# Altium footprint library SAMTEC SMD.PcbLib: 165 footprints (part 9 of 17) (continued)
## SAMTEC_QMSS-026-06.75-L-D-PC4 [mm] "52 (2x26) Contacts, Pitch 0.635mm, Straight Double Row 0,635 mm, Q2 Shielded Ground Plane Combo Power Terminal Strip"
height 7.54
pads (61):
  rect 0.41x1.4 smd mask+0: 1(-7.938,-3.365) 2(-7.938,3.365) 3(-7.303,-3.365) 4(-7.303,3.365) 5(-6.668,-3.365) 6(-6.668,3.365) 7(-6.033,-3.365) 8(-6.033,3.365) 9(-5.398,-3.365) 10(-5.398,3.365) 11(-4.763,-3.365) 12(-4.763,3.365) 13(-4.128,-3.365) 14(-4.128,3.365) 15(-3.493,-3.365) 16(-3.493,3.365) 17(-2.858,-3.365) 18(-2.858,3.365) 19(-2.223,-3.365) 20(-2.223,3.365) 21(-1.588,-3.365) 22(-1.588,3.365) 23(-0.953,-3.365) 24(-0.953,3.365) 25(-0.318,-3.365) 26(-0.318,3.365) 27(0.317,-3.365) 28(0.317,3.365) 29(0.952,-3.365) 30(0.952,3.365) 31(1.587,-3.365) 32(1.587,3.365) 33(2.222,-3.365) 34(2.222,3.365) 35(2.857,-3.365) 36(2.857,3.365) 37(3.492,-3.365) 38(3.492,3.365) 39(4.127,-3.365) 40(4.127,3.365) 41(4.762,-3.365) 42(4.762,3.365) 43(5.397,-3.365) 44(5.397,3.365) 45(6.032,-3.365) 46(6.032,3.365) 47(6.667,-3.365) 48(6.667,3.365) 49(7.302,-3.365) 50(7.302,3.365) 51(7.937,-3.365) 52(7.937,3.365)
  rect 17.27x0.51 smd mask+0: P0(0,0)
  round 1.5 hole 0.75: P1(-15.355,-1.27) P2(-15.355,1.27) P3(-13.355,-1.27) P4(-13.355,1.27) P5(13.355,-1.27) P6(13.355,1.27) P7(15.355,-1.27) P8(15.355,1.27)
Top Layer:
  region: 16.155,-2.75 16.155,-0.21 14.555,-0.21 14.555,-2.75
  region: 14.155,-2.75 14.155,-0.21 12.555,-0.21 12.555,-2.75
  region: 16.155,0.21 16.155,2.75 14.555,2.75 14.555,0.21
  region: 16.155,0.21 16.155,2.75 14.555,2.75 14.555,0.21
  region: 14.155,0.21 14.155,2.75 12.555,2.75 12.555,0.21
  region: -12.555,-2.75 -12.555,-0.21 -14.155,-0.21 -14.155,-2.75
  region: -14.555,-2.75 -14.555,-0.21 -16.155,-0.21 -16.155,-2.75
  region: -12.555,0.21 -12.555,2.75 -14.155,2.75 -14.155,0.21
  region: -12.555,0.21 -12.555,2.75 -14.155,2.75 -14.155,0.21
  region: -14.555,0.21 -14.555,2.75 -16.155,2.75 -16.155,0.21
Top Overlay:
  drawing of 374 lines, arcs and shapes, not listed
  text "P8" at 14.957,4.125 h0.8
  text "P1" at -15.757,-4.925 h0.8
Mechanical 8:
  drawing of 404 lines, arcs and shapes, not listed
Mechanical 14:
  drawing of 475 lines, arcs and shapes, not listed
  text "P8" at 14.957,4.125 h0.8
  text "P1" at -15.757,-4.925 h0.8
Mechanical 15:
  lines w0.05: -17.522,-4.315 -17.522,4.315 17.522,4.315 17.522,-4.315 -17.522,-4.315
3D body "SAMTEC_QMSS-026-06.75-L-D-PC4.stp": height 7.62, standoff -1.73, extent -17.272,-3.759 17.272,3.759

## SAMTEC_QMSS-052-06.75-L-D-PC4 [mm] "104(4x26) Contacts, Pitch 0.635mm, Straight Double Row 0,635 mm, Q2 Shielded Ground Plane Combo Power Terminal Strip"
height 7.54
pads (114):
  rect 0.41x1.4 smd mask+0: 1(-18.602,-3.365) 2(-18.602,3.365) 3(-17.967,-3.365) 4(-17.967,3.365) 5(-17.332,-3.365) 6(-17.332,3.365) 7(-16.697,-3.365) 8(-16.697,3.365) 9(-16.062,-3.365) 10(-16.062,3.365) 11(-15.427,-3.365) 12(-15.427,3.365) 13(-14.792,-3.365) 14(-14.792,3.365) 15(-14.157,-3.365) 16(-14.157,3.365) 17(-13.522,-3.365) 18(-13.522,3.365) 19(-12.887,-3.365) 20(-12.887,3.365) 21(-12.252,-3.365) 22(-12.252,3.365) 23(-11.617,-3.365) 24(-11.617,3.365) 25(-10.982,-3.365) 26(-10.982,3.365) 27(-10.347,-3.365) 28(-10.347,3.365) 29(-9.712,-3.365) 30(-9.712,3.365) 31(-9.077,-3.365) 32(-9.077,3.365) 33(-8.442,-3.365) 34(-8.442,3.365) 35(-7.807,-3.365) 36(-7.807,3.365) 37(-7.172,-3.365) 38(-7.172,3.365) 39(-6.537,-3.365) 40(-6.537,3.365) 41(-5.902,-3.365) 42(-5.902,3.365) 43(-5.267,-3.365) 44(-5.267,3.365) 45(-4.632,-3.365) 46(-4.632,3.365) 47(-3.997,-3.365) 48(-3.997,3.365) 49(-3.362,-3.365) 50(-3.362,3.365) 51(-2.727,-3.365) 52(-2.727,3.365) 53(2.728,-3.365) 54(2.728,3.365) 55(3.363,-3.365) 56(3.363,3.365) 57(3.998,-3.365) 58(3.998,3.365) 59(4.633,-3.365) 60(4.633,3.365) 61(5.268,-3.365) 62(5.268,3.365) 63(5.903,-3.365) 64(5.903,3.365) 65(6.538,-3.365) 66(6.538,3.365) 67(7.173,-3.365) 68(7.173,3.365) 69(7.808,-3.365) 70(7.808,3.365) 71(8.443,-3.365) 72(8.443,3.365) 73(9.078,-3.365) 74(9.078,3.365) 75(9.713,-3.365) 76(9.713,3.365) 77(10.348,-3.365) 78(10.348,3.365) 79(10.983,-3.365) 80(10.983,3.365) 81(11.618,-3.365) 82(11.618,3.365) 83(12.253,-3.365) 84(12.253,3.365) 85(12.888,-3.365) 86(12.888,3.365) 87(13.523,-3.365) 88(13.523,3.365) 89(14.158,-3.365) 90(14.158,3.365) 91(14.793,-3.365) 92(14.793,3.365) 93(15.428,-3.365) 94(15.428,3.365) 95(16.063,-3.365) 96(16.063,3.365) 97(16.698,-3.365) 98(16.698,3.365) 99(17.333,-3.365) 100(17.333,3.365) 101(17.968,-3.365) 102(17.968,3.365) 103(18.603,-3.365) 104(18.603,3.365)
  round 1.5 hole 0.75: P1(-26.02,-1.27) P2(-26.02,1.27) P3(-24.02,-1.27) P4(-24.02,1.27) P5(24.026,-1.27) P6(24.026,1.27) P7(26.026,-1.27) P8(26.026,1.27)
  rect 17.27x0.51 smd mask+0: P01(-10.665,0) P02(10.665,0)
Top Layer:
  region: -23.22,-2.75 -23.22,-0.21 -24.82,-0.21 -24.82,-2.75
  region: -25.22,-2.75 -25.22,-0.21 -26.82,-0.21 -26.82,-2.75
  region: -23.22,0.21 -23.22,2.75 -24.82,2.75 -24.82,0.21
  region: -23.22,0.21 -23.22,2.75 -24.82,2.75 -24.82,0.21
  region: -25.22,0.21 -25.22,2.75 -26.82,2.75 -26.82,0.21
  region: 26.826,-2.75 26.826,-0.21 25.226,-0.21 25.226,-2.75
  region: 24.826,-2.75 24.826,-0.21 23.226,-0.21 23.226,-2.75
  region: 26.826,0.21 26.826,2.75 25.226,2.75 25.226,0.21
  region: 26.826,0.21 26.826,2.75 25.226,2.75 25.226,0.21
  region: 24.826,0.21 24.826,2.75 23.226,2.75 23.226,0.21
Top Overlay:
  drawing of 664 lines, arcs and shapes, not listed
  text "P8" at 25.628,4.125 h0.8
  text "P1" at -26.422,-4.925 h0.8
Mechanical 8:
  drawing of 736 lines, arcs and shapes, not listed
Mechanical 14:
  drawing of 784 lines, arcs and shapes, not listed
  text "P8" at 25.628,4.125 h0.8
  text "P1" at -26.422,-4.925 h0.8
Mechanical 15:
  lines w0.05: -28.187,-4.315 -28.187,4.315 28.193,4.315 28.193,-4.315 -28.187,-4.315
3D body "SAMTEC_QMSS-052-06.75-L-D-PC4.stp": height 7.62, standoff -1.73, extent -27.937,-3.759 27.943,3.759

## SAMTEC_QRF8-052-01-L-RA-GP-K [mm] "104 Contacts (2x52), Pitch 0.8mm, Right Angle Ground Plane Socket, QRF8-RA Series"
height 5.13
pads (127):
  rect 0.5x1.25 smd: 1(-22.4,-1.415) 2(-22.4,1.415) 3(-21.6,-1.415) 4(-21.6,1.415) 5(-20.8,-1.415) 6(-20.8,1.415) 7(-20,-1.415) 8(-20,1.415) 9(-19.2,-1.415) 10(-19.2,1.415) 11(-18.4,-1.415) 12(-18.4,1.415) 13(-17.6,-1.415) 14(-17.6,1.415) 15(-16.8,-1.415) 16(-16.8,1.415) 17(-16,-1.415) 18(-16,1.415) 19(-15.2,-1.415) 20(-15.2,1.415) 21(-14.4,-1.415) 22(-14.4,1.415) 23(-13.6,-1.415) 24(-13.6,1.415) 25(-12.8,-1.415) 26(-12.8,1.415) 27(-12,-1.415) 28(-12,1.415) 29(-11.2,-1.415) 30(-11.2,1.415) 31(-10.4,-1.415) 32(-10.4,1.415) 33(-9.6,-1.415) 34(-9.6,1.415) 35(-8.8,-1.415) 36(-8.8,1.415) 37(-8,-1.415) 38(-8,1.415) 39(-7.2,-1.415) 40(-7.2,1.415) 41(-6.4,-1.415) 42(-6.4,1.415) 43(-5.6,-1.415) 44(-5.6,1.415) 45(-4.8,-1.415) 46(-4.8,1.415) 47(-4,-1.415) 48(-4,1.415) 49(-3.2,-1.415) 50(-3.2,1.415) 51(-2.4,-1.415) 52(-2.4,1.415) 53(2.4,-1.415) 54(2.4,1.415) 55(3.2,-1.415) 56(3.2,1.415) 57(4,-1.415) 58(4,1.415) 59(4.8,-1.415) 60(4.8,1.415) 61(5.6,-1.415) 62(5.6,1.415) 63(6.4,-1.415) 64(6.4,1.415) 65(7.2,-1.415) 66(7.2,1.415) 67(8,-1.415) 68(8,1.415) 69(8.8,-1.415) 70(8.8,1.415) 71(9.6,-1.415) 72(9.6,1.415) 73(10.4,-1.415) 74(10.4,1.415) 75(11.2,-1.415) 76(11.2,1.415) 77(12,-1.415) 78(12,1.415) 79(12.8,-1.415) 80(12.8,1.415) 81(13.6,-1.415) 82(13.6,1.415) 83(14.4,-1.415) 84(14.4,1.415) 85(15.2,-1.415) 86(15.2,1.415) 87(16,-1.415) 88(16,1.415) 89(16.8,-1.415) 90(16.8,1.415) 91(17.6,-1.415) 92(17.6,1.415) 93(18.4,-1.415) 94(18.4,1.415) 95(19.2,-1.415) 96(19.2,1.415) 97(20,-1.415) 98(20,1.415) 99(20.8,-1.415) 100(20.8,1.415) 101(21.6,-1.415) 102(21.6,1.415) 103(22.4,-1.415) 104(22.4,1.415)
  round 1.05 hole 0.55: 105(-22.02,0) 106(-19.27,0) 107(-16.52,0) 108(-13.77,0) 109(-11.02,0) 110(-8.27,0) 111(-5.52,0) 112(-2.77,0) 113(2.78,0) 114(5.53,0) 115(8.28,0) 116(11.03,0) 117(13.78,0) 118(16.53,0) 119(19.28,0) 120(22.03,0)
  round 1.4 hole 0.7: 121(-27.4,5.155) 122(27.4,5.155) 123(0,3.965) 124(-24.66,-1.355) 125(24.66,-1.355)
  round 0.5 hole 1.45 unplated mask+0.475: 126(-25.3,3.525) 127(25.3,3.525)
Top Overlay:
  circle w0.25: c-23.325,-1.6 r0.125
  lines w0.2: -28.075,4.291 -28.075,-2.555 -23.988,-2.555 -23.988,-2.221 ; -28.075,5.899 -28.075,6.575 -27.423,6.575 -27.423,9.205 -24.702,9.205 -23.98,7.955 23.98,7.955 24.702,9.205 27.423,9.205 27.423,6.575 28.075,6.575 28.075,5.899 ; -23.971,-0.623 -23.387,2.295 -23.283,2.295 ; -23,-1.032 -23.283,-1.032 -23.283,2.295 ; -23,2.295 -23.283,2.295 ; -1.8,-1.032 -1.532,-1.032 -1.532,2.295 ; -1.8,2.295 1.8,2.295 ; 1.518,2.295 1.518,-1.032 1.8,-1.032 ; 23,-1.032 23.267,-1.032 23.267,2.295 ; 23,2.295 23.267,2.295 ; 23.971,-0.623 23.387,2.295 23.267,2.295 ; 23.988,-2.221 23.988,-2.555 28.075,-2.555 28.075,4.291
Mechanical 8:
  drawing of 754 lines, arcs and shapes, not listed
  text "Board Edge" at -5.7,7.725 h1.2
Mechanical 14:
  circle w0.1: c-23.323,-1.6 r0.25
  lines w0.1: -1.532,2.295 -1.532,-1.032 -23.283,-1.032 -23.283,2.295 ; 1.518,2.295 1.518,-1.032 23.267,-1.032 23.267,2.295 ; -23.283,2.295 23.267,2.295 ; -23.283,2.295 -23.387,2.295 -23.988,-0.705 -23.988,-2.555 -28.075,-2.555 -28.075,6.575 -27.423,6.575 -27.423,9.205 -24.702,9.205 -23.98,7.955 23.98,7.955 24.702,9.205 27.423,9.205 27.423,6.575 28.075,6.575 28.075,-2.555 23.988,-2.555 23.988,-0.705 23.387,2.295 23.267,2.295
Mechanical 15:
  lines w0.05: -28.325,-2.805 -28.325,9.455 28.325,9.455 28.325,-2.805 -28.325,-2.805
3D body "SAMTEC_QRF8-052-01-L-RA-GP-K.stp": height 5.13, standoff -1.33, extent -28.075,-2.555 28.075,9.205

## SAMTEC_QRF8-078-01-L-RA-GP [mm] "156 Contacts (3x52), Pitch 0.8mm, Right Angle Ground Plane Socket, QRF8-RA Series"
height 5.13
pads (188):
  rect 0.5x1.25 smd: 1(-34.8,-1.415) 2(-34.8,1.415) 3(-34,-1.415) 4(-34,1.415) 5(-33.2,-1.415) 6(-33.2,1.415) 7(-32.4,-1.415) 8(-32.4,1.415) 9(-31.6,-1.415) 10(-31.6,1.415) 11(-30.8,-1.415) 12(-30.8,1.415) 13(-30,-1.415) 14(-30,1.415) 15(-29.2,-1.415) 16(-29.2,1.415) 17(-28.4,-1.415) 18(-28.4,1.415) 19(-27.6,-1.415) 20(-27.6,1.415) 21(-26.8,-1.415) 22(-26.8,1.415) 23(-26,-1.415) 24(-26,1.415) 25(-25.2,-1.415) 26(-25.2,1.415) 27(-24.4,-1.415) 28(-24.4,1.415) 29(-23.6,-1.415) 30(-23.6,1.415) 31(-22.8,-1.415) 32(-22.8,1.415) 33(-22,-1.415) 34(-22,1.415) 35(-21.2,-1.415) 36(-21.2,1.415) 37(-20.4,-1.415) 38(-20.4,1.415) 39(-19.6,-1.415) 40(-19.6,1.415) 41(-18.8,-1.415) 42(-18.8,1.415) 43(-18,-1.415) 44(-18,1.415) 45(-17.2,-1.415) 46(-17.2,1.415) 47(-16.4,-1.415) 48(-16.4,1.415) 49(-15.6,-1.415) 50(-15.6,1.415) 51(-14.8,-1.415) 52(-14.8,1.415) 53(-10,-1.415) 54(-10,1.415) 55(-9.2,-1.415) 56(-9.2,1.415) 57(-8.4,-1.415) 58(-8.4,1.415) 59(-7.6,-1.415) 60(-7.6,1.415) 61(-6.8,-1.415) 62(-6.8,1.415) 63(-6,-1.415) 64(-6,1.415) 65(-5.2,-1.415) 66(-5.2,1.415) 67(-4.4,-1.415) 68(-4.4,1.415) 69(-3.6,-1.415) 70(-3.6,1.415) 71(-2.8,-1.415) 72(-2.8,1.415) 73(-2,-1.415) 74(-2,1.415) 75(-1.2,-1.415) 76(-1.2,1.415) 77(-0.4,-1.415) 78(-0.4,1.415) 79(0.4,-1.415) 80(0.4,1.415) 81(1.2,-1.415) 82(1.2,1.415) 83(2,-1.415) 84(2,1.415) 85(2.8,-1.415) 86(2.8,1.415) 87(3.6,-1.415) 88(3.6,1.415) 89(4.4,-1.415) 90(4.4,1.415) 91(5.2,-1.415) 92(5.2,1.415) 93(6,-1.415) 94(6,1.415) 95(6.8,-1.415) 96(6.8,1.415) 97(7.6,-1.415) 98(7.6,1.415) 99(8.4,-1.415) 100(8.4,1.415) 101(9.2,-1.415) 102(9.2,1.415) 103(10,-1.415) 104(10,1.415) 105(14.8,-1.415) 106(14.8,1.415) 107(15.6,-1.415) 108(15.6,1.415) 109(16.4,-1.415) 110(16.4,1.415) 111(17.2,-1.415) 112(17.2,1.415) 113(18,-1.415) 114(18,1.415) 115(18.8,-1.415) 116(18.8,1.415) 117(19.6,-1.415) 118(19.6,1.415) 119(20.4,-1.415) 120(20.4,1.415) 121(21.2,-1.415) 122(21.2,1.415) 123(22,-1.415) 124(22,1.415) 125(22.8,-1.415) 126(22.8,1.415) 127(23.6,-1.415) 128(23.6,1.415) 129(24.4,-1.415) 130(24.4,1.415) 131(25.2,-1.415) 132(25.2,1.415) 133(26,-1.415) 134(26,1.415) 135(26.8,-1.415) 136(26.8,1.415) 137(27.6,-1.415) 138(27.6,1.415) 139(28.4,-1.415) 140(28.4,1.415) 141(29.2,-1.415) 142(29.2,1.415) 143(30,-1.415) 144(30,1.415) 145(30.8,-1.415) 146(30.8,1.415) 147(31.6,-1.415) 148(31.6,1.415) 149(32.4,-1.415) 150(32.4,1.415) 151(33.2,-1.415) 152(33.2,1.415) 153(34,-1.415) 154(34,1.415) 155(34.8,-1.415) 156(34.8,1.415)
  round 1.05 hole 0.55: 157(-34.42,0) 158(-31.67,0) 159(-28.92,0) 160(-26.17,0) 161(-23.42,0) 162(-20.67,0) 163(-17.92,0) 164(-15.17,0) 165(-9.62,0) 166(-6.87,0) 167(-4.12,0) 168(-1.37,0) 169(1.38,0) 170(4.13,0) 171(6.88,0) 172(9.63,0) 173(15.18,0) 174(17.93,0) 175(20.68,0) 176(23.43,0) 177(26.18,0) 178(28.93,0) 179(31.68,0) 180(34.43,0)
  round 1.4 hole 0.7: 181(-39.8,5.155) 182(39.8,5.155) 183(-12.4,3.965) 184(12.4,3.965) 185(-37.06,-1.355) 186(37.06,-1.355)
  round 0.5 hole 1.45 unplated mask+0.475: 187(-37.7,3.525) 188(37.7,3.525)
Top Overlay:
  circle w0.25: c-35.725,-1.6 r0.125
  lines w0.2: -40.475,4.286 -40.475,-1.042 -38.955,-2.562 -36.38,-2.562 -36.38,-2.22 ; -40.475,6.024 -40.475,6.549 -40.123,6.549 ccw(c-40.123,6.849) -39.823,6.849 -39.823,9.199 -36.835,9.199 -36.38,7.949 ; -36.38,-0.49 -36.38,7.949 ; -36.342,-0.522 -35.78,2.289 -35.45,2.289 ; -35.8,7.949 -34.8,5.949 -33.77,7.949 ; -35.675,-0.889 -35.675,2.289 ; -35.675,0.259 -35.802,0.259 -35.802,-0.889 -35.45,-0.889 ; -35.3,2.44 -35.3,4.139 -14.3,4.139 -14.3,2.44 ; -14.15,-0.889 -13.798,-0.889 -13.798,0.259 -13.925,0.259 ; -14.15,2.289 -12.775,2.289 ; -13.925,-0.889 -13.925,2.289 ; -12.025,2.289 -10.65,2.289 ; -10.875,-0.889 -10.875,2.289 ; -10.875,0.259 -11.002,0.259 -11.002,-0.889 -10.65,-0.889 ; -10.5,2.44 -10.5,4.139 -3.3,4.139 -3.3,2.44 ; 3.3,2.44 3.3,4.139 10.5,4.139 10.5,2.44 ; 10.65,-0.889 11.002,-0.889 11.002,0.259 10.875,0.259 ; 10.65,2.289 12.025,2.289 ; 10.875,-0.889 10.875,2.289 ; 12.775,2.289 14.15,2.289 ; 13.925,-0.889 13.925,2.289 ; 13.925,0.259 13.798,0.259 13.798,-0.889 14.15,-0.889 ; 14.3,2.44 14.3,4.139 35.3,4.139 35.3,2.44 ; 35.45,-0.889 35.802,-0.889 35.802,0.259 35.675,0.259 ; 35.45,2.289 35.78,2.289 36.342,-0.522 ; 35.675,-0.889 35.675,2.289 ; 36.38,-2.22 36.38,-2.562 40.475,-2.562 40.475,4.286 ; 36.38,-0.49 36.38,7.949 ; 40.475,6.024 40.475,6.549 40.123,6.549 cw(c40.123,6.849) 39.823,6.849 39.823,9.199 36.835,9.199 36.38,7.949 ; -36.38,7.949 36.38,7.949
Mechanical 8:
  drawing of 1107 lines, arcs and shapes, not listed
  text "Board Edge" at -5.7,7.725 h1.2
Mechanical 14:
  drawing of 311 lines, arcs and shapes, not listed
Mechanical 15:
  lines w0.05: -40.725,-1.145 -40.725,9.449 40.725,9.449 40.725,-2.812 -39.059,-2.812 -40.725,-1.145
3D body "SAMTEC_QRF8-078-01-L-RA-GP.stp": height 5.13, standoff -1.3, extent -40.475,-2.561 40.475,9.199

## SAMTEC_QRM8-052-01-L-RA-GP-K [mm] "104 Contacts (2x52), Pitch 0.8mm, Right Angle Ground Plane Header, QRM8-RA Serie"
height 5.13
pads (127):
  rect 0.5x1.25 smd: 1(22.4,-1.415) 2(22.4,1.415) 3(21.6,-1.415) 4(21.6,1.415) 5(20.8,-1.415) 6(20.8,1.415) 7(20,-1.415) 8(20,1.415) 9(19.2,-1.415) 10(19.2,1.415) 11(18.4,-1.415) 12(18.4,1.415) 13(17.6,-1.415) 14(17.6,1.415) 15(16.8,-1.415) 16(16.8,1.415) 17(16,-1.415) 18(16,1.415) 19(15.2,-1.415) 20(15.2,1.415) 21(14.4,-1.415) 22(14.4,1.415) 23(13.6,-1.415) 24(13.6,1.415) 25(12.8,-1.415) 26(12.8,1.415) 27(12,-1.415) 28(12,1.415) 29(11.2,-1.415) 30(11.2,1.415) 31(10.4,-1.415) 32(10.4,1.415) 33(9.6,-1.415) 34(9.6,1.415) 35(8.8,-1.415) 36(8.8,1.415) 37(8,-1.415) 38(8,1.415) 39(7.2,-1.415) 40(7.2,1.415) 41(6.4,-1.415) 42(6.4,1.415) 43(5.6,-1.415) 44(5.6,1.415) 45(4.8,-1.415) 46(4.8,1.415) 47(4,-1.415) 48(4,1.415) 49(3.2,-1.415) 50(3.2,1.415) 51(2.4,-1.415) 52(2.4,1.415) 53(-2.4,-1.415) 54(-2.4,1.415) 55(-3.2,-1.415) 56(-3.2,1.415) 57(-4,-1.415) 58(-4,1.415) 59(-4.8,-1.415) 60(-4.8,1.415) 61(-5.6,-1.415) 62(-5.6,1.415) 63(-6.4,-1.415) 64(-6.4,1.415) 65(-7.2,-1.415) 66(-7.2,1.415) 67(-8,-1.415) 68(-8,1.415) 69(-8.8,-1.415) 70(-8.8,1.415) 71(-9.6,-1.415) 72(-9.6,1.415) 73(-10.4,-1.415) 74(-10.4,1.415) 75(-11.2,-1.415) 76(-11.2,1.415) 77(-12,-1.415) 78(-12,1.415) 79(-12.8,-1.415) 80(-12.8,1.415) 81(-13.6,-1.415) 82(-13.6,1.415) 83(-14.4,-1.415) 84(-14.4,1.415) 85(-15.2,-1.415) 86(-15.2,1.415) 87(-16,-1.415) 88(-16,1.415) 89(-16.8,-1.415) 90(-16.8,1.415) 91(-17.6,-1.415) 92(-17.6,1.415) 93(-18.4,-1.415) 94(-18.4,1.415) 95(-19.2,-1.415) 96(-19.2,1.415) 97(-20,-1.415) 98(-20,1.415) 99(-20.8,-1.415) 100(-20.8,1.415) 101(-21.6,-1.415) 102(-21.6,1.415) 103(-22.4,-1.415) 104(-22.4,1.415)
  round 1.05 hole 0.55: 105(22.02,0) 106(19.27,0) 107(16.52,0) 108(13.77,0) 109(11.02,0) 110(8.27,0) 111(5.52,0) 112(2.77,0) 113(-2.78,0) 114(-5.53,0) 115(-8.28,0) 116(-11.03,0) 117(-13.78,0) 118(-16.53,0) 119(-19.28,0) 120(-22.03,0)
  round 1.4 hole 0.7: 121(-28.455,2.995) 122(28.455,2.995) 123(0,3.665) 124(-24.705,-1.545) 125(24.705,-1.545)
  round 0.5 hole 1.45 unplated mask+0.475: 126(-25.3,1.705) 127(25.3,1.705)
Top Overlay:
  drawing of 766 lines, arcs and shapes, not listed
Mechanical 8:
  drawing of 753 lines, arcs and shapes, not listed
Mechanical 14:
  drawing of 1178 lines, arcs and shapes, not listed
Mechanical 15:
  lines w0.05: -29.38,-2.995 29.38,-2.995 29.38,4.595 26.825,4.595 26.825,9.305 24.435,9.305 24.435,7.805 -24.435,7.805 -24.435,9.305 -26.825,9.305 -26.825,4.595 -29.38,4.595 -29.38,-2.995
3D body "SAMTEC_QRM8-052-01-L-RA-GP-K.stp": height 5.13, standoff -1.3, extent -29.13,-2.745 29.13,9.055

## SAMTEC_QRM8-078-01-L-RA-GP [mm] "156 Contacts (3x52), Pitch 0.8mm, Right Angle Ground Plane Header, QRM8-RA Serie"
height 5.13
pads (188):
  rect 0.5x1.25 smd: 1(34.8,-1.415) 2(34.8,1.415) 3(34,-1.415) 4(34,1.415) 5(33.2,-1.415) 6(33.2,1.415) 7(32.4,-1.415) 8(32.4,1.415) 9(31.6,-1.415) 10(31.6,1.415) 11(30.8,-1.415) 12(30.8,1.415) 13(30,-1.415) 14(30,1.415) 15(29.2,-1.415) 16(29.2,1.415) 17(28.4,-1.415) 18(28.4,1.415) 19(27.6,-1.415) 20(27.6,1.415) 21(26.8,-1.415) 22(26.8,1.415) 23(26,-1.415) 24(26,1.415) 25(25.2,-1.415) 26(25.2,1.415) 27(24.4,-1.415) 28(24.4,1.415) 29(23.6,-1.415) 30(23.6,1.415) 31(22.8,-1.415) 32(22.8,1.415) 33(22,-1.415) 34(22,1.415) 35(21.2,-1.415) 36(21.2,1.415) 37(20.4,-1.415) 38(20.4,1.415) 39(19.6,-1.415) 40(19.6,1.415) 41(18.8,-1.415) 42(18.8,1.415) 43(18,-1.415) 44(18,1.415) 45(17.2,-1.415) 46(17.2,1.415) 47(16.4,-1.415) 48(16.4,1.415) 49(15.6,-1.415) 50(15.6,1.415) 51(14.8,-1.415) 52(14.8,1.415) 53(10,-1.415) 54(10,1.415) 55(9.2,-1.415) 56(9.2,1.415) 57(8.4,-1.415) 58(8.4,1.415) 59(7.6,-1.415) 60(7.6,1.415) 61(6.8,-1.415) 62(6.8,1.415) 63(6,-1.415) 64(6,1.415) 65(5.2,-1.415) 66(5.2,1.415) 67(4.4,-1.415) 68(4.4,1.415) 69(3.6,-1.415) 70(3.6,1.415) 71(2.8,-1.415) 72(2.8,1.415) 73(2,-1.415) 74(2,1.415) 75(1.2,-1.415) 76(1.2,1.415) 77(0.4,-1.415) 78(0.4,1.415) 79(-0.4,-1.415) 80(-0.4,1.415) 81(-1.2,-1.415) 82(-1.2,1.415) 83(-2,-1.415) 84(-2,1.415) 85(-2.8,-1.415) 86(-2.8,1.415) 87(-3.6,-1.415) 88(-3.6,1.415) 89(-4.4,-1.415) 90(-4.4,1.415) 91(-5.2,-1.415) 92(-5.2,1.415) 93(-6,-1.415) 94(-6,1.415) 95(-6.8,-1.415) 96(-6.8,1.415) 97(-7.6,-1.415) 98(-7.6,1.415) 99(-8.4,-1.415) 100(-8.4,1.415) 101(-9.2,-1.415) 102(-9.2,1.415) 103(-10,-1.415) 104(-10,1.415) 105(-14.8,-1.415) 106(-14.8,1.415) 107(-15.6,-1.415) 108(-15.6,1.415) 109(-16.4,-1.415) 110(-16.4,1.415) 111(-17.2,-1.415) 112(-17.2,1.415) 113(-18,-1.415) 114(-18,1.415) 115(-18.8,-1.415) 116(-18.8,1.415) 117(-19.6,-1.415) 118(-19.6,1.415) 119(-20.4,-1.415) 120(-20.4,1.415) 121(-21.2,-1.415) 122(-21.2,1.415) 123(-22,-1.415) 124(-22,1.415) 125(-22.8,-1.415) 126(-22.8,1.415) 127(-23.6,-1.415) 128(-23.6,1.415) 129(-24.4,-1.415) 130(-24.4,1.415) 131(-25.2,-1.415) 132(-25.2,1.415) 133(-26,-1.415) 134(-26,1.415) 135(-26.8,-1.415) 136(-26.8,1.415) 137(-27.6,-1.415) 138(-27.6,1.415) 139(-28.4,-1.415) 140(-28.4,1.415) 141(-29.2,-1.415) 142(-29.2,1.415) 143(-30,-1.415) 144(-30,1.415) 145(-30.8,-1.415) 146(-30.8,1.415) 147(-31.6,-1.415) 148(-31.6,1.415) 149(-32.4,-1.415) 150(-32.4,1.415) 151(-33.2,-1.415) 152(-33.2,1.415) 153(-34,-1.415) 154(-34,1.415) 155(-34.8,-1.415) 156(-34.8,1.415)
  round 1.05 hole 0.55: 157(34.42,0) 158(31.67,0) 159(28.92,0) 160(26.17,0) 161(23.42,0) 162(20.67,0) 163(17.92,0) 164(15.17,0) 165(9.62,0) 166(6.87,0) 167(4.12,0) 168(1.37,0) 169(-1.38,0) 170(-4.13,0) 171(-6.88,0) 172(-9.63,0) 173(-15.18,0) 174(-17.93,0) 175(-20.68,0) 176(-23.43,0) 177(-26.18,0) 178(-28.93,0) 179(-31.68,0) 180(-34.43,0)
  round 1.4 hole 0.7: 181(-40.855,2.995) 182(40.855,2.995) 183(-12.4,3.665) 184(12.4,3.665) 185(-37.105,-1.545) 186(37.105,-1.545)
  round 0.5 hole 1.45 unplated mask+0.475: 187(-37.7,1.705) 188(37.7,1.705)
Top Overlay:
  circle w0.25: c35.75,-1.8 r0.125
  lines w0.2: -41.53,2.126 -41.53,-2.747 -36.425,-2.747 -36.425,-2.41 ; -41.53,3.864 -41.53,4.344 -40.375,4.344 -40.208,3.885 ; -39.775,2.894 -36.725,2.894 ccw(c-36.725,3.394) -36.225,3.394 -36.225,4.704 -12.763,4.704 ; -38.975,2.894 -38.975,8.014 ; -37.085,2.894 -37.085,8.014 ; -37.085,7.554 37.085,7.554 ; -36.34,-0.754 -35.775,2.289 -35.45,2.289 ; -36.225,4.344 -13.266,4.344 ; -35.675,-0.889 -35.675,2.289 ; -35.675,0.259 -35.802,0.259 -35.802,-0.889 -35.45,-0.889 ; -35.15,2.44 -35.15,4.344 ; -35.15,3.439 -14.45,3.439 -14.45,2.44 ; -14.15,-0.889 -13.798,-0.889 -13.798,0.259 -13.925,0.259 ; -13.925,-0.889 -13.925,2.289 ; -13.45,2.289 -13.45,3.337 ; -12.775,2.631 -12.775,2.289 -14.15,2.289 -10.65,2.289 -12.025,2.289 -12.025,2.631 ; -12.037,4.704 12.037,4.704 ; -11.534,4.344 11.534,4.344 ; -11.35,2.289 -11.35,3.337 ; -10.875,-0.889 -10.875,2.289 ; -10.875,0.259 -11.002,0.259 -11.002,-0.889 -10.65,-0.889 ; -10.35,2.44 -10.35,3.439 -2,3.439 -2,2.44 ; 2,2.44 2,3.439 10.35,3.439 10.35,2.44 ; 10.65,-0.889 11.002,-0.889 11.002,0.259 10.875,0.259 ; 10.875,-0.889 10.875,2.289 ; 11.35,2.289 11.35,3.337 ; 12.025,2.289 12.025,2.631 ; 12.763,4.704 36.225,4.704 36.225,3.394 ccw(c36.725,3.394) 36.725,2.894 39.775,2.894 ; 12.775,2.631 12.775,2.289 14.15,2.289 ; 13.266,4.344 36.225,4.344 ; 13.45,2.289 13.45,3.337 ; 13.925,-0.889 13.925,2.289 ; 13.925,0.259 13.798,0.259 13.798,-0.889 14.15,-0.889 ; 14.45,2.44 14.45,3.439 35.15,3.439 ; 35.15,2.44 35.15,4.344 ; 35.325,4.344 35.7,3.144 36.075,4.344 ; 35.45,-0.889 35.802,-0.889 35.802,0.259 35.675,0.259 ; 35.45,2.289 35.775,2.289 36.34,-0.754 ; 35.675,-0.889 35.675,2.289 ; 36.425,-2.41 36.425,-2.747 40.01,-2.747 41.53,-1.226 41.53,2.126 ; 37.085,2.894 37.085,8.014 ; 38.975,2.894 38.975,8.014 ; 40.208,3.885 40.375,4.344 41.53,4.344 41.53,3.864 ; -38.975,8.014 -38.375,9.054 -37.685,9.054 -37.085,8.014 ; -38.975,8.014 -37.085,8.014 ; 37.085,8.014 37.685,9.054 38.375,9.054 38.975,8.014 ; 37.085,8.014 38.975,8.014
Mechanical 8:
  drawing of 1103 lines, arcs and shapes, not listed
Mechanical 14:
  drawing of 639 lines, arcs and shapes, not listed
Mechanical 15:
  lines w0.05: -41.78,-2.997 -41.78,4.594 -39.225,4.594 -39.225,9.304 39.225,9.304 39.225,4.594 41.78,4.594 41.78,-1.33 40.114,-2.997 -41.78,-2.997
3D body "SAMTEC_QRM8-078-01-L-RA-GP.stp": height 5.13, standoff -2.12, extent -41.53,-2.746 41.53,9.054

## SAMTEC_QSE-056-01-L-D-DP-A-K-TR [mm] "112 Contacts Female, Pitch 0.8mm, Straight Double Row Differential Pair High Speed Ground Plane Socket"
height 3.25
pads (130):
  rect 0.406x2.273 smd mask+0: 1(-37.6,-2.865) 2(-37.6,2.865) 3(-36.8,-2.865) 4(-36.8,2.865) 5(-35.2,-2.865) 6(-35.2,2.865) 7(-34.4,-2.865) 8(-34.4,2.865) 9(-32.8,-2.865) 10(-32.8,2.865) 11(-32,-2.865) 12(-32,2.865) 13(-30.4,-2.865) 14(-30.4,2.865) 15(-29.6,-2.865) 16(-29.6,2.865) 17(-28,-2.865) 18(-28,2.865) 19(-27.2,-2.865) 20(-27.2,2.865) 21(-25.6,-2.865) 22(-25.6,2.865) 23(-24.8,-2.865) 24(-24.8,2.865) 25(-23.2,-2.865) 26(-23.2,2.865) 27(-22.4,-2.865) 28(-22.4,2.865) 29(-17.6,-2.865) 30(-17.6,2.865) 31(-16.8,-2.865) 32(-16.8,2.865) 33(-15.2,-2.865) 34(-15.2,2.865) 35(-14.4,-2.865) 36(-14.4,2.865) 37(-12.8,-2.865) 38(-12.8,2.865) 39(-12,-2.865) 40(-12,2.865) 41(-10.4,-2.865) 42(-10.4,2.865) 43(-9.6,-2.865) 44(-9.6,2.865) 45(-8,-2.865) 46(-8,2.865) 47(-7.2,-2.865) 48(-7.2,2.865) 49(-5.6,-2.865) 50(-5.6,2.865) 51(-4.8,-2.865) 52(-4.8,2.865) 53(-3.2,-2.865) 54(-3.2,2.865) 55(-2.4,-2.865) 56(-2.4,2.865) 57(2.4,-2.865) 58(2.4,2.865) 59(3.2,-2.865) 60(3.2,2.865) 61(4.8,-2.865) 62(4.8,2.865) 63(5.6,-2.865) 64(5.6,2.865) 65(7.2,-2.865) 66(7.2,2.865) 67(8,-2.865) 68(8,2.865) 69(9.6,-2.865) 70(9.6,2.865) 71(10.4,-2.865) 72(10.4,2.865) 73(12,-2.865) 74(12,2.865) 75(12.8,-2.865) 76(12.8,2.865) 77(14.4,-2.865) 78(14.4,2.865) 79(15.2,-2.865) 80(15.2,2.865) 81(16.8,-2.865) 82(16.8,2.865) 83(17.6,-2.865) 84(17.6,2.865) 85(22.4,-2.865) 86(22.4,2.865) 87(23.2,-2.865) 88(23.2,2.865) 89(24.8,-2.865) 90(24.8,2.865) 91(25.6,-2.865) 92(25.6,2.865) 93(27.2,-2.865) 94(27.2,2.865) 95(28,-2.865) 96(28,2.865) 97(29.6,-2.865) 98(29.6,2.865) 99(30.4,-2.865) 100(30.4,2.865) 101(32,-2.865) 102(32,2.865) 103(32.8,-2.865) 104(32.8,2.865) 105(34.4,-2.865) 106(34.4,2.865) 107(35.2,-2.865) 108(35.2,2.865) 109(36.8,-2.865) 110(36.8,2.865) 111(37.6,-2.865) 112(37.6,2.865)
  rect 2.54x0.43 smd mask+0: 113(-38.065,0) 116(-21.935,0) 117(-18.065,0) 120(-1.935,0) 121(1.935,0) 124(18.065,0) 125(21.935,0) 128(38.065,0)
  rect 4.699x0.432 smd mask+0: 114(-33.195,0) 115(-26.845,0) 118(-13.195,0) 119(-6.845,0) 122(6.805,0) 123(13.155,0) 126(26.805,0) 127(33.155,0)
  round 0.5 hole 1 unplated mask+0.25: 177(-40.065,2.665) 178(40.065,2.665)
Top Overlay:
  circle w0.25: c-37.575,-4.55 r0.125
  lines w0.2: -40.64,1.973 -40.64,-3.62 -38.15,-3.62 ; -40.64,3.357 -40.64,3.62 -38.15,3.62 ; -38.15,-3.112 -40.081,-3.112 -40.081,1.383 -38.352,3.112 -38.15,3.112 ; -38.15,-1.905 -38.322,-1.905 -38.322,-0.73 -37.751,-0.73 -37.751,-0.565 ; -38.15,1.905 -38.322,1.905 -38.322,0.73 -37.751,0.73 -37.751,0.565 ; -22.257,-0.565 -22.257,-0.73 -21.685,-0.73 -21.685,-1.905 -21.85,-1.905 ; -22.257,0.565 -22.257,0.73 -21.685,0.73 -21.685,1.905 -21.85,1.905 ; -21.85,-3.62 -18.15,-3.62 ; -21.85,-3.112 -18.15,-3.112 ; -21.85,3.112 -18.15,3.112 ; -21.85,3.62 -18.15,3.62 ; -18.15,-1.905 -18.32,-1.905 -18.32,-0.73 -17.748,-0.73 -17.748,-0.565 ; -18.15,1.905 -18.32,1.905 -18.32,0.73 -17.748,0.73 -17.748,0.565 ; -2.254,-0.565 -2.254,-0.73 -1.683,-0.73 -1.683,-1.905 -1.85,-1.905 ; -2.254,0.565 -2.254,0.73 -1.683,0.73 -1.683,1.905 -1.85,1.905 ; -1.85,-3.62 1.85,-3.62 ; -1.85,-3.112 1.85,-3.112 ; -1.85,3.112 1.85,3.112 ; -1.85,3.62 1.85,3.62 ; 1.85,-1.905 1.683,-1.905 1.683,-0.73 2.254,-0.73 2.254,-0.565 ; 1.85,1.905 1.683,1.905 1.683,0.73 2.254,0.73 2.254,0.565 ; 17.748,-0.565 17.748,-0.73 18.32,-0.73 18.32,-1.905 18.15,-1.905 ; 17.748,0.565 17.748,0.73 18.32,0.73 18.32,1.905 18.15,1.905 ; 18.15,-3.62 21.85,-3.62 ; 18.15,-3.112 21.85,-3.112 ; 18.15,3.112 21.85,3.112 ; 18.15,3.62 21.85,3.62 ; 21.85,-1.905 21.685,-1.905 21.685,-0.73 22.257,-0.73 22.257,-0.565 ; 21.85,1.905 21.685,1.905 21.685,0.73 22.257,0.73 22.257,0.565 ; 37.751,-0.565 37.751,-0.73 38.322,-0.73 38.322,-1.905 38.15,-1.905 ; 37.751,0.565 37.751,0.73 38.322,0.73 38.322,1.905 38.15,1.905 ; 38.15,-3.62 40.64,-3.62 40.64,1.973 ; 38.15,-3.112 40.081,-3.112 40.081,1.383 38.352,3.112 38.15,3.112 ; 38.15,3.62 40.64,3.62 40.64,3.357
Mechanical 8:
  drawing of 790 lines, arcs and shapes, not listed
Mechanical 14:
  drawing of 779 lines, arcs and shapes, not listed
Mechanical 15:
  lines w0.05: -40.89,-4.25 -40.89,4.25 40.89,4.25 40.89,-4.25 -40.89,-4.25
3D body "SAMTEC_QSE-056-01-L-D-DP-A-K-TR.stp": height 3.25, standoff -0.75, extent -40.64,-3.746 40.64,3.747